# Altium footprint library ICPOWER.PcbLib: 71 footprints (part 4 of 5)
Each footprint in its own frame and in the unit in brackets; x right, y up, seen from the top. Pads: shape width x height; smd on the part's side, far side on the other; paste and mask are expansions set on the pad; w line width, h text height; cw(c..) or ccw(c..) is an arc to the next point about the centre after c.
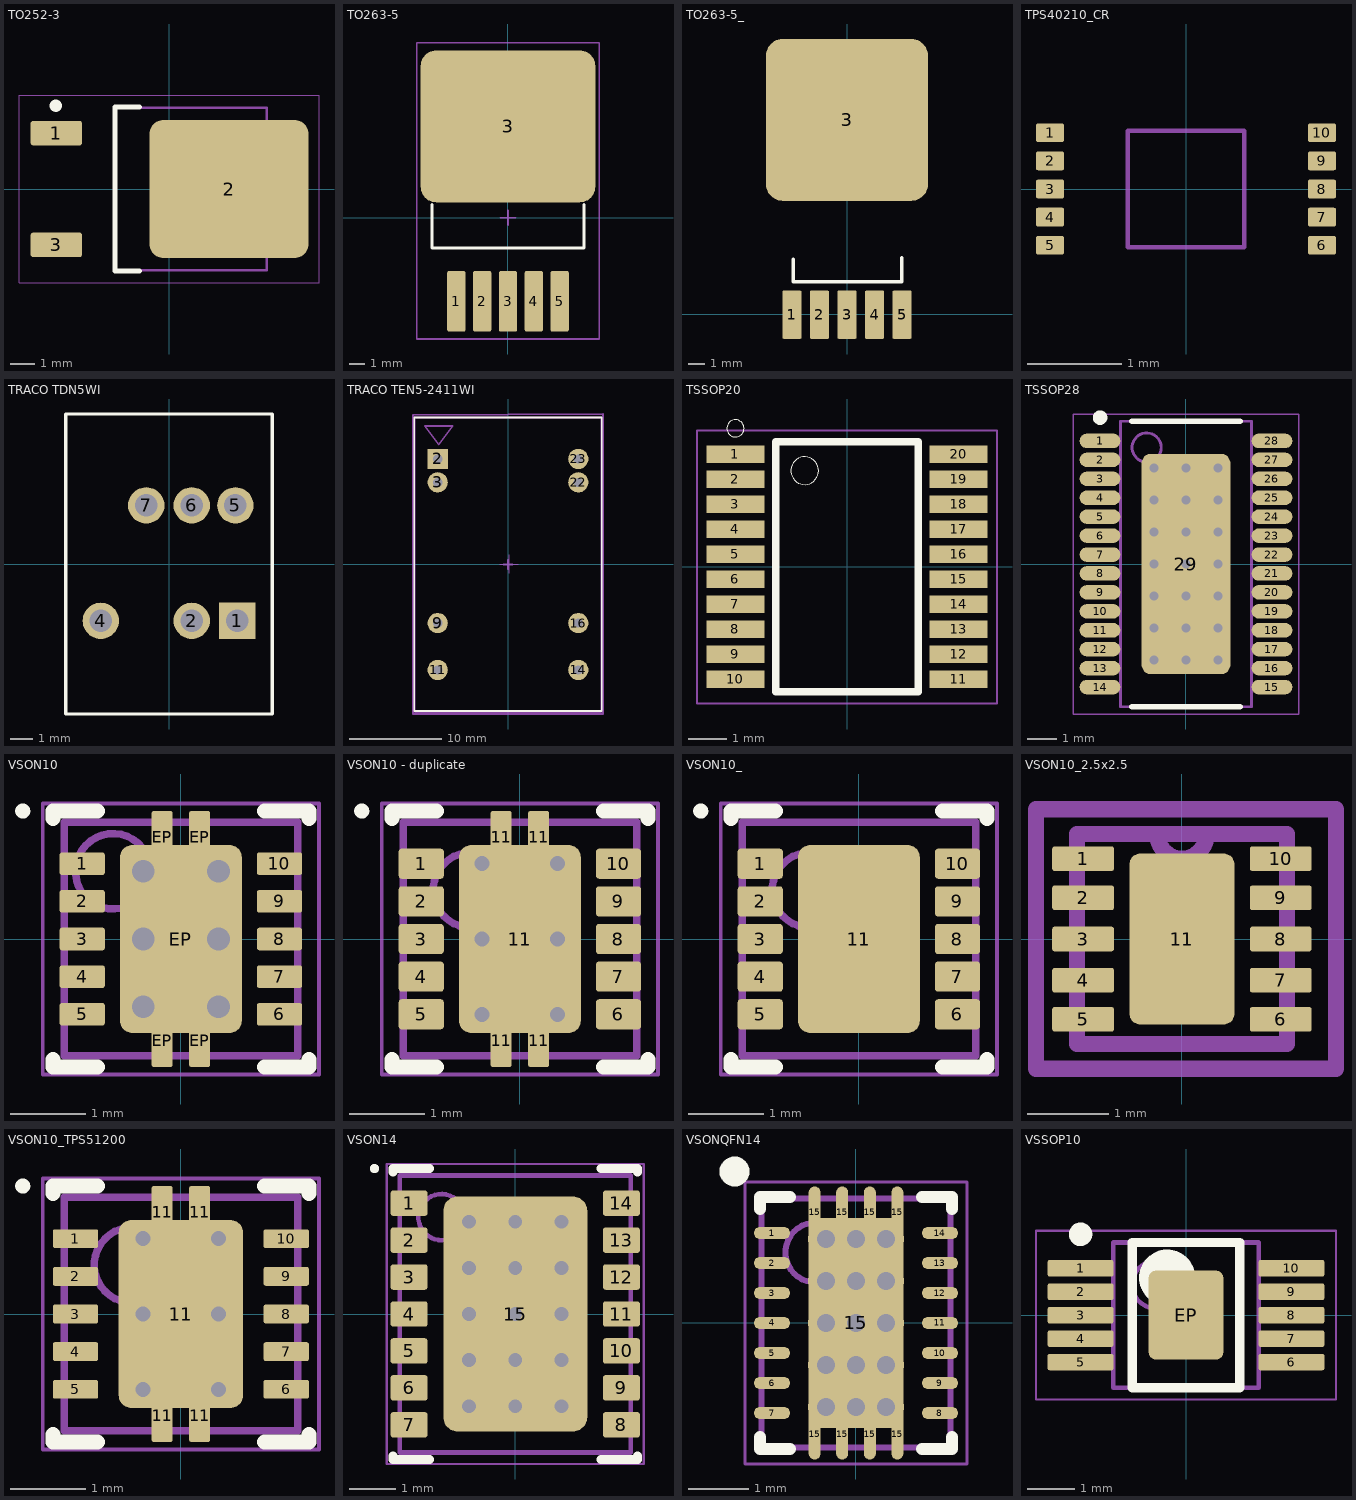
[diagram p3: the footprints below, top view; thin cyan lines are the x and y axes]

## TO252-3 [mm] "DPAK, IPC LOW DENSITY"
height 2.3
pads (3):
  rrect20% 2.1x1 smd: 1(-4.6,2.28) 3(-4.6,-2.28)
  rrect20% 6.5x5.65 smd: 2(2.45,0)
Top Overlay:
  circle w0.25: c-4.625,3.4 r0.125
  lines w0.2: -1.2,-3.35 -2.2,-3.35 -2.2,3.35 -1.2,3.35
Mechanical 13:
  lines w0.1: -2.2,-3.325 -2.2,3.325 4,3.325 4,-3.325 -2.2,-3.325
Mechanical 15:
  lines w0.05: -6.125,-3.825 -6.125,3.825 6.125,3.825 6.125,-3.825 -6.125,-3.825
  lines w0.1: -0.5,0 0.5,0 ; 0,-0.5 0,0.5
3D body "User Library-DPAK_TO-252AA.step": height 2.42, standoff 0.02, extent -4.9,-3.359 5.2,3.375

## TO263-5 [mm]
height 0.025
pads (6):
  rrect20% 1.2x4 smd mask+0.102: 1(-3.4,-5.5) 2(-1.7,-5.5) 3(0,-5.5) 4(1.7,-5.5) 5(3.4,-5.5)
  rrect20% 11.5x10 smd: 3(0,6.017)
Top Overlay:
  lines w0.203: -5,0.862 -5,-1.983 5,-1.983 5,0.862
Mechanical 15:
  lines w0.1: -0.5,0 0.5,0 ; 0,-0.5 0,0.5 ; -6,-7.983 6,-7.983 6,11.517 -6,11.517 -6,-7.983
3D body "SW3dPS-TO263-5.STEP": height 4.83, standoff 0.03, extent -5,-6.973 5,8.697

## TO263-5_ [mm]
height 0.025
pads (6):
  rrect20% 1.2x3 smd mask+0.102: 1(-3.4,-0.033) 2(-1.7,-0.033) 3(0,-0.033) 4(1.7,-0.033) 5(3.4,-0.033)
  rrect20% 10x10 smd: 3(0,12)
Top Overlay:
  lines w0.203: -3.317,3.4 -3.317,1.999 3.389,1.999 3.389,3.5
3D body "SW3dPS-TO263-5.STEP": height 4.83, standoff 0.03, extent -5,-0.99 5,14.68

## TPS40210_CR [mm]
pads (10):
  rrect20% 0.3x0.2 smd mask+0.025: 1(-1.45,0.6) 2(-1.45,0.3) 3(-1.45,0) 4(-1.45,-0.3) 5(-1.45,-0.6) 6(1.45,-0.6) 7(1.45,-0.3) 8(1.45,0) 9(1.45,0.3) 10(1.45,0.6)
M1_3D_TOP:
  lines w0.05: -0.623,-0.619 -0.623,0.619 ; -0.619,-0.623 0.619,-0.623 ; -0.619,0.623 0.619,0.623 ; 0.623,-0.619 0.623,0.619
3D body: height 0.42, standoff 0.38, extent 1.41,-0.615 1.44,-0.585
3D body: height 0.4, standoff 0, extent 1.41,-0.615 1.44,-0.585
3D body: height 0.42, standoff 0.38, extent 1.41,-0.315 1.44,-0.285
3D body: height 0.4, standoff 0, extent 1.41,-0.315 1.44,-0.285
3D body: height 0.42, standoff 0.38, extent 1.41,-0.015 1.44,0.015
3D body: height 0.4, standoff 0, extent 1.41,-0.015 1.44,0.015
3D body: height 0.42, standoff 0.38, extent 1.385,0.285 1.415,0.315
3D body: height 0.4, standoff 0, extent 1.385,0.285 1.415,0.315
3D body: height 0.42, standoff 0.38, extent 1.41,0.61 1.44,0.64
3D body: height 0.4, standoff 0, extent 1.41,0.61 1.44,0.64
3D body: height 0.41, standoff 0.38, extent 0.419,0.077 1.403,0.315
3D body: height 0.41, standoff 0.38, extent 0.429,-0.611 1.425,-0.459
3D body: height 0.41, standoff 0.38, extent 0.428,-0.315 1.426,-0.198
3D body: height 0.41, standoff 0.38, extent 0.426,-0.09 1.426,0.01
3D body: height 0.41, standoff 0.38, extent 0.432,0.475 1.427,0.644
3D body: height 0.4, standoff 0, extent -1.44,-0.615 -1.41,-0.585
3D body: height 0.42, standoff 0.38, extent -1.44,-0.615 -1.41,-0.585
3D body: height 0.4, standoff 0, extent -1.44,-0.315 -1.41,-0.285
3D body: height 0.42, standoff 0.38, extent -1.44,-0.315 -1.41,-0.285
3D body: height 0.4, standoff 0, extent -1.44,0.585 -1.41,0.615
3D body: height 0.42, standoff 0.38, extent -1.44,0.585 -1.41,0.615
3D body: height 0.4, standoff 0, extent -1.44,0.285 -1.41,0.315
3D body: height 0.42, standoff 0.38, extent -1.44,0.285 -1.41,0.315
3D body: height 0.42, standoff 0.38, extent -1.44,-0.015 -1.41,0.015
3D body: height 0.4, standoff 0, extent -1.44,-0.015 -1.41,0.015
3D body: height 0.38, standoff 0.01, extent -0.625,-0.625 0.625,0.625
3D body: height 0.4, standoff 0.39, extent -0.5,0.425 -0.375,0.55
3D body: height 0.4, standoff 0.39, extent -0.5,0.063 -0.375,0.188
3D body: height 0.4, standoff 0.39, extent -0.5,-0.075 -0.375,0.05
3D body: height 0.4, standoff 0.39, extent -0.5,-0.325 -0.375,-0.2
3D body: height 0.4, standoff 0.39, extent -0.5,-0.575 -0.375,-0.45
3D body: height 0.4, standoff 0.39, extent 0.375,-0.125 0.5,0
3D body: height 0.4, standoff 0.39, extent 0.375,0.013 0.5,0.138
3D body: height 0.4, standoff 0.39, extent 0.375,-0.525 0.5,-0.4
3D body: height 0.4, standoff 0.39, extent 0.375,-0.275 0.5,-0.15
3D body: height 0.4, standoff 0.39, extent 0.375,0.45 0.5,0.575
3D body: height 0.41, standoff 0.38, extent -1.426,0.467 -0.43,0.619
3D body: height 0.41, standoff 0.38, extent -1.423,0.109 -0.433,0.312
3D body: height 0.41, standoff 0.38, extent -1.425,-0.032 -0.425,0.015
3D body: height 0.41, standoff 0.38, extent -1.425,-0.322 -0.424,-0.258
3D body: height 0.41, standoff 0.38, extent -1.426,-0.611 -0.427,-0.494

## TRACO TDN5WI [mm]
pads (6):
  rect 1.6x1.6 hole 1: 1(3,-2.5)
  round 1.6 hole 1: 2(1,-2.5) 4(-3,-2.5) 5(2.92,2.58) 6(1,2.58) 7(-1,2.58)
Top Overlay:
  lines w0.152: -4.55,-6.6 -4.55,6.6 4.55,6.6 4.55,-6.6 -4.55,-6.6

## TRACO TEN5-2411WI [mm] "TEN5-2411WI"
pads (8):
  rect 2.2x2.2 hole 1: 2(-7.62,11.43)
  round 2.2 hole 1: 3(-7.62,8.89) 9(-7.62,-6.35) 11(-7.62,-11.43) 14(7.62,-11.43) 16(7.62,-6.35) 22(7.62,8.89) 23(7.62,11.43)
Top Overlay:
  lines w0.2: -10.15,-15.87 10.15,-15.87 10.15,15.93 -10.15,15.93 -10.15,-15.87
M3_comm_top:
  text ".comment" at -3,-0.5 h2
M5_asm_top:
  lines w0.2: -10.1,-16 10.1,-16 10.1,15.93 -10.1,15.93 -10.1,-16 ; -9,15 -6,15 -7.5,13 -9,15
  text ".Designator" at -2.2,16.5 h2
M7_courtyard_top:
  lines w0.2: -0.5,0 0.5,0 ; 0,-0.5 0,0.5 ; -10.3,-16.2 -10.3,16.2 10.3,16.3 10.3,-16.2 -10.3,-16.2
Mechanical 15:
  lines w0.1: -0.87,0.03 1.13,0.03 ; 0.13,-0.97 0.13,1.03
3D body "User Library-TracoPSU-Ten5-2423.step": height 10.06, standoff -2, extent -10,-16 10,16

## TSSOP20 [mm] "BQ7692000PW"
pads (20):
  rect 1.5x0.45 smd: 1(-2.9,2.925) 2(-2.9,2.275) 3(-2.9,1.625) 4(-2.9,0.975) 5(-2.9,0.325) 6(-2.9,-0.325) 7(-2.9,-0.975) 8(-2.9,-1.625) 9(-2.9,-2.275) 10(-2.9,-2.925) 11(2.9,-2.925) 12(2.9,-2.275) 13(2.9,-1.625) 14(2.9,-0.975) 15(2.9,-0.325) 16(2.9,0.325) 17(2.9,0.975) 18(2.9,1.625) 19(2.9,2.275) 20(2.9,2.925)
Top Overlay:
  circle w0: c-2.9,3.6 r0.224
  circle w0: c-1.1,2.5 r0.361
  lines w0.2: -1.85,-3.25 -1.85,3.25 1.85,3.25 1.85,-3.25 -1.85,-3.25
M1_3D_TOP:
  lines w0.05: -3.9,-3.55 -3.9,3.55 3.9,3.55 3.9,-3.55 -3.9,-3.55

## TSSOP28 [mm] "EXPOSEDPAD, IPC Medium Density"
height 1.2
pads (29):
  oval 1.4x0.5 smd: 1(-2.95,4.225) 2(-2.95,3.575) 3(-2.95,2.925) 4(-2.95,2.275) 5(-2.95,1.625) 6(-2.95,0.975) 7(-2.95,0.325) 8(-2.95,-0.325) 9(-2.95,-0.975) 10(-2.95,-1.625) 11(-2.95,-2.275) 12(-2.95,-2.925) 13(-2.95,-3.575) 14(-2.95,-4.225) 15(2.95,-4.225) 16(2.95,-3.575) 17(2.95,-2.925) 18(2.95,-2.275) 19(2.95,-1.625) 20(2.95,-0.975) 21(2.95,-0.325) 22(2.95,0.325) 23(2.95,0.975) 24(2.95,1.625) 25(2.95,2.275) 26(2.95,2.925) 27(2.95,3.575) 28(2.95,4.225)
  rrect20% 3.05x7.56 smd: 29(0,0)
via 1.1,-3.3 diameter 0.6 hole 0.3
via 0,-3.3 diameter 0.6 hole 0.3
via -1.1,-3.3 diameter 0.6 hole 0.3
via 1.1,-2.2 diameter 0.6 hole 0.3
via 0,-2.2 diameter 0.6 hole 0.3
via -1.1,-2.2 diameter 0.6 hole 0.3
via 1.1,-1.1 diameter 0.6 hole 0.3
via 0,-1.1 diameter 0.6 hole 0.3
via -1.1,-1.1 diameter 0.6 hole 0.3
via 1.1,0 diameter 0.6 hole 0.3
via 0,0 diameter 0.6 hole 0.3
via -1.1,0 diameter 0.6 hole 0.3
via 1.1,1.1 diameter 0.6 hole 0.3
via 0,1.1 diameter 0.6 hole 0.3
via -1.1,1.1 diameter 0.6 hole 0.3
via 1.1,2.2 diameter 0.6 hole 0.3
via 0,2.2 diameter 0.6 hole 0.3
via -1.1,2.2 diameter 0.6 hole 0.3
via 1.1,3.3 diameter 0.6 hole 0.3
via 0,3.3 diameter 0.6 hole 0.3
via -1.1,3.3 diameter 0.6 hole 0.3
Top Overlay:
  circle w0.25: c-2.95,5.025 r0.125
  lines w0.2: -1.85,-4.9 1.85,-4.9 ; -1.85,4.9 1.85,4.9
Mechanical 13:
  circle w0.1: c-1.35,4 r0.5
  lines w0.1: -2.25,-4.9 2.25,-4.9 2.25,4.9 -2.25,4.9 -2.25,-4.9
Mechanical 15:
  lines w0.05: -3.875,-5.15 3.875,-5.15 3.875,5.15 -3.875,5.15 -3.875,-5.15
  lines w0.1: -0.5,0 0.5,0 ; 0,-0.5 0,0.5
3D body "TSSOP-28_P065.STEP": height 0.98, standoff -0.01, extent -3.2,-4.85 3.2,4.85

## VSON10 [mm] "TPS40210DRCR  , VSON10, IPC Medium Density"
height 1
pads (15):
  rrect20% 0.6x0.3 smd: 1(-1.31,1) 2(-1.31,0.5) 3(-1.31,0) 4(-1.31,-0.5) 5(-1.31,-1) 6(1.31,-1) 7(1.31,-0.5) 8(1.31,0) 9(1.31,0.5) 10(1.31,1)
  rrect20% 0.28x0.7 smd: EP(-0.25,-1.35) EP(-0.25,1.35) EP(0.25,-1.35) EP(0.25,1.35)
  rrect20% 1.62x2.5 smd: EP(0,0)
via 0.5,0 diameter 0.6 hole 0.3
via -0.5,0 diameter 0.6 hole 0.3
via 0.5,-0.9 diameter 0.6 hole 0.3
via -0.5,-0.9 diameter 0.6 hole 0.3
via -0.5,0.9 diameter 0.6 hole 0.3
via 0.5,0.9 diameter 0.6 hole 0.3
Top Overlay:
  circle w0.1: c-2.1,1.7 r0.05
  lines w0.2: -1.7,-1.6 -1.7,-1.7 -1.11,-1.7 ; -1.7,1.6 -1.7,1.7 -1.11,1.7 ; 1.11,-1.7 1.7,-1.7 1.7,-1.6 ; 1.11,1.7 1.7,1.7 1.7,1.6
M3_comm_top:
  text ".comment" at -2.9,-1.3 h2
M5_asm_top:
  circle w0.1: c-0.9,0.9 r0.5
  lines w0.1: -1.55,-1.55 1.55,-1.55 1.55,1.55 -1.55,1.55 -1.55,-1.55
  text ".Designator" at -1.11,1.7 h2
M7_courtyard_top:
  lines w0.05: -1.835,-1.8 1.835,-1.8 1.835,1.8 -1.835,1.8 -1.835,-1.8
  lines w0.1: -0.5,0 0.5,0 ; 0,-0.5 0,0.5
3D body: height 1, standoff 0.05, extent -1.55,-1.55 1.55,1.55

## VSON10 - duplicate [mm] "VSON10, IPC Medium Density"
height 1
pads (15):
  rrect20% 0.6x0.4 smd: 1(-1.31,1) 2(-1.31,0.5) 3(-1.31,0) 4(-1.31,-0.5) 5(-1.31,-1) 6(1.31,-1) 7(1.31,-0.5) 8(1.31,0) 9(1.31,0.5) 10(1.31,1)
  rrect20% 0.28x0.7 smd: 11(-0.25,-1.35) 11(-0.25,1.35) 11(0.25,-1.35) 11(0.25,1.35)
  rrect20% 1.62x2.5 smd: 11(0,0)
via 0.5,-1 diameter 0.5 hole 0.2
via -0.5,-1 diameter 0.5 hole 0.2
via 0.5,0 diameter 0.5 hole 0.2
via -0.5,0 diameter 0.5 hole 0.2
via 0.5,1 diameter 0.5 hole 0.2
via -0.5,1 diameter 0.5 hole 0.2
Top Overlay:
  circle w0.1: c-2.1,1.7 r0.05
  lines w0.2: -1.7,-1.6 -1.7,-1.7 -1.11,-1.7 ; -1.7,1.6 -1.7,1.7 -1.11,1.7 ; 1.11,-1.7 1.7,-1.7 1.7,-1.6 ; 1.11,1.7 1.7,1.7 1.7,1.6
Mechanical 13:
  circle w0.1: c-0.65,0.65 r0.5
  lines w0.1: -1.55,-1.55 1.55,-1.55 1.55,1.55 -1.55,1.55 -1.55,-1.55
Mechanical 15:
  lines w0.05: -1.835,-1.8 1.835,-1.8 1.835,1.8 -1.835,1.8 -1.835,-1.8
  lines w0.1: -0.5,0 0.5,0 ; 0,-0.5 0,0.5
3D body: height 1, standoff 0.05, extent -1.55,-1.55 1.55,1.55

## VSON10_ [mm] "VSON10, IPC Medium Density"
height 1
pads (11):
  rrect20% 0.6x0.4 smd mask+0.025: 1(-1.31,1) 2(-1.31,0.5) 3(-1.31,0) 4(-1.31,-0.5) 5(-1.31,-1) 6(1.31,-1) 7(1.31,-0.5) 8(1.31,0) 9(1.31,0.5) 10(1.31,1)
  rrect20% 1.62x2.5 smd mask+0.025: 11(0,0)
Top Overlay:
  circle w0.1: c-2.1,1.7 r0.05
  lines w0.2: -1.7,-1.6 -1.7,-1.7 -1.11,-1.7 ; -1.7,1.6 -1.7,1.7 -1.11,1.7 ; 1.11,-1.7 1.7,-1.7 1.7,-1.6 ; 1.11,1.7 1.7,1.7 1.7,1.6
Mechanical 13:
  circle w0.1: c-0.65,0.65 r0.5
  lines w0.1: -1.55,-1.55 1.55,-1.55 1.55,1.55 -1.55,1.55 -1.55,-1.55
Mechanical 15:
  lines w0.05: -1.835,-1.8 1.835,-1.8 1.835,1.8 -1.835,1.8 -1.835,-1.8
  lines w0.1: -0.5,0 0.5,0 ; 0,-0.5 0,0.5
3D body: height 1, standoff 0.05, extent -1.55,-1.55 1.55,1.55

## VSON10_2.5x2.5 [mil] "TPS63030"
pads (11):
  rrect20% 30x12 smd: 1(-48,39) 2(-48,20) 3(-48,0) 4(-48,-20) 5(-48,-39) 6(48,-39) 7(48,-20) 8(48,0) 9(48,20) 10(48,39)
  rrect20% 51x83 smd: 11(0,0)
M3_comm_top:
  text ".comment" at -35.43,-11.81 h39.37
M5_asm_top:
  lines w7.87: -51,-51 -51,51 ; -51,-51 51,-51 ; -51,-51 -51,51 ; -51,-51 51,-51 ; -51,51 -12,51 ; -51,51 -12,51 ; -12,51 ccw(c0,51) 12,51 ; -12,51 ccw(c0,51) 12,51 ; -12,51 12,51 ; -12,51 12,51 ; 12,51 51,51 ; 12,51 51,51 ; 51,-51 51,51 ; 51,-51 51,51
  text ".Designator" at -47.24,62.99 h39.37
M7_courtyard_top:
  lines w7.87: -19.68,0 19.68,0 ; 0,-19.68 0,19.68 ; -70.87,-62.99 74.8,-62.99 74.8,62.99 -70.87,62.99 -70.87,-62.99
3D body "TPS74801.step": height 39.37, standoff 0, extent -59.05,-59.06 59.06,59.06

## VSON10_TPS51200 [mm] "TPS51200, VSON10, IPC Medium Density"
height 1
pads (15):
  rrect20% 0.6x0.25 smd: 1(-1.4,1) 2(-1.4,0.5) 3(-1.4,0) 4(-1.4,-0.5) 5(-1.4,-1) 6(1.4,-1) 7(1.4,-0.5) 8(1.4,0) 9(1.4,0.5) 10(1.4,1)
  rrect20% 0.28x0.7 smd: 11(-0.25,-1.35) 11(-0.25,1.35) 11(0.25,-1.35) 11(0.25,1.35)
  rrect20% 1.65x2.5 smd: 11(0,0)
via 0.5,-1 diameter 0.5 hole 0.2
via -0.5,-1 diameter 0.5 hole 0.2
via 0.5,0 diameter 0.5 hole 0.2
via -0.5,0 diameter 0.5 hole 0.2
via 0.5,1 diameter 0.5 hole 0.2
via -0.5,1 diameter 0.5 hole 0.2
Top Overlay:
  circle w0.1: c-2.1,1.7 r0.05
  lines w0.2: -1.7,-1.6 -1.7,-1.7 -1.11,-1.7 ; -1.7,1.6 -1.7,1.7 -1.11,1.7 ; 1.11,-1.7 1.7,-1.7 1.7,-1.6 ; 1.11,1.7 1.7,1.7 1.7,1.6
Mechanical 13:
  circle w0.1: c-0.65,0.65 r0.5
  lines w0.1: -1.55,-1.55 1.55,-1.55 1.55,1.55 -1.55,1.55 -1.55,-1.55
Mechanical 15:
  lines w0.05: -1.835,-1.8 1.835,-1.8 1.835,1.8 -1.835,1.8 -1.835,-1.8
  lines w0.1: -0.5,0 0.5,0 ; 0,-0.5 0,0.5
3D body: height 1, standoff 0.05, extent -1.55,-1.55 1.55,1.55

## VSON14 [mm] "VSON, IPC Medium Density"
height 1
pads (15):
  rrect20% 0.8x0.55 smd: 1(-2.3,2.4) 2(-2.3,1.6) 3(-2.3,0.8) 4(-2.3,0) 5(-2.3,-0.8) 6(-2.3,-1.6) 7(-2.3,-2.4) 8(2.3,-2.4) 9(2.3,-1.6) 10(2.3,-0.8) 11(2.3,0) 12(2.3,0.8) 13(2.3,1.6) 14(2.3,2.4)
  rrect20% 3.12x5.1 smd paste-1.56 mask+0: 15(0,0)
via 1,-2 diameter 0.6 hole 0.3
via 0,-2 diameter 0.6 hole 0.3
via -1,-2 diameter 0.6 hole 0.3
via 1,-1 diameter 0.6 hole 0.3
via 0,-1 diameter 0.6 hole 0.3
via -1,-1 diameter 0.6 hole 0.3
via 1,0 diameter 0.6 hole 0.3
via 0,0 diameter 0.6 hole 0.3
via -1,0 diameter 0.6 hole 0.3
via 1,1 diameter 0.6 hole 0.3
via 0,1 diameter 0.6 hole 0.3
via -1,1 diameter 0.6 hole 0.3
via 1,2 diameter 0.6 hole 0.3
via 0,2 diameter 0.6 hole 0.3
via -1,2 diameter 0.6 hole 0.3
Top Overlay:
  circle w0.1: c-3.05,3.15 r0.05
  lines w0.2: -2.65,-3.075 -2.65,-3.15 -1.86,-3.15 ; -2.65,3.075 -2.65,3.15 -1.86,3.15 ; 1.86,-3.15 2.65,-3.15 2.65,-3.075 ; 1.86,3.15 2.65,3.15 2.65,3.075
Top Paste:
  rectangle: 0.1,-2.46 1.46,-1.38
  rectangle: 0.1,-1.18 1.46,-0.1
  rectangle: 0.1,0.1 1.46,1.18
  rectangle: 0.1,1.38 1.46,2.46
  rectangle: -1.46,-2.46 -0.1,-1.38
  rectangle: -1.46,-1.18 -0.1,-0.1
  rectangle: -1.46,0.1 -0.1,1.18
  rectangle: -1.46,1.38 -0.1,2.46
Mechanical 13:
  circle w0.1: c-1.6,2.1 r0.5
  lines w0.1: -2.5,-3 2.5,-3 2.5,3 -2.5,3 -2.5,-3
Mechanical 15:
  lines w0.05: -2.785,-3.25 2.785,-3.25 2.785,3.25 -2.785,3.25 -2.785,-3.25
  lines w0.1: -0.5,0 0.5,0 ; 0,-0.5 0,0.5
3D body: height 1, standoff 0.1, extent -2.5,-3 2.5,3

## VSONQFN14 [mm] "PQFN, IPC Medium Density"
height 1
pads (23):
  oval 0.6x0.2 smd: 1(-1.4,1.5) 2(-1.4,1) 3(-1.4,0.5) 4(-1.4,0) 5(-1.4,-0.5) 6(-1.4,-1) 7(-1.4,-1.5) 8(1.4,-1.5) 9(1.4,-1) 10(1.4,-0.5) 11(1.4,0) 12(1.4,0.5) 13(1.4,1) 14(1.4,1.5)
  oval 0.2x0.85 smd: 15(-0.69,-1.85) 15(-0.69,1.85) 15(-0.23,-1.85) 15(-0.23,1.85) 15(0.23,-1.85) 15(0.23,1.85) 15(0.69,-1.85) 15(0.69,1.85)
  rect 1.58x3.5 smd: 15(0,0)
via 0,0 diameter 0.6 hole 0.3
via 0,-0.7 diameter 0.6 hole 0.3
via 0,0.7 diameter 0.6 hole 0.3
via 0,1.4 diameter 0.6 hole 0.3
via 0,-1.4 diameter 0.6 hole 0.3
via 0.5,-1.4 diameter 0.6 hole 0.3
via 0.5,1.4 diameter 0.6 hole 0.3
via 0.5,0.7 diameter 0.6 hole 0.3
via 0.5,-0.7 diameter 0.6 hole 0.3
via 0.5,0 diameter 0.6 hole 0.3
via -0.5,1.4 diameter 0.6 hole 0.3
via -0.5,0.7 diameter 0.6 hole 0.3
via -0.5,-0.7 diameter 0.6 hole 0.3
via -0.5,0 diameter 0.6 hole 0.3
via -0.5,-1.4 diameter 0.6 hole 0.3
Top Overlay:
  circle w0.25: c-2.025,2.525 r0.125
  lines w0.2: -1.6,-1.9 -1.6,-2.1 -1.1,-2.1 ; -1.6,1.9 -1.6,2.1 -1.1,2.1 ; 1.1,-2.1 1.6,-2.1 1.6,-1.9 ; 1.1,2.1 1.6,2.1 1.6,1.9
Mechanical 13:
  circle w0.1: c-0.675,1.175 r0.5
  lines w0.1: -1.575,-2.075 1.575,-2.075 1.575,2.075 -1.575,2.075 -1.575,-2.075
Mechanical 15:
  lines w0.05: -1.85,-2.35 1.85,-2.35 1.85,2.35 -1.85,2.35 -1.85,-2.35
  lines w0.1: -0.5,0 0.5,0 ; 0,-0.5 0,0.5
3D body "VSON-14-1.step": height 1.05, standoff 0, extent -1.602,-2.126 1.608,2.084

## VSSOP10 [mm] "TPS40210DGQR, VSSOP10, IPC Medium Density"
height 1.1
pads (11):
  rrect20% 1.4x0.35 smd mask+0.05: 1(-2.25,1) 2(-2.25,0.5) 3(-2.25,0) 4(-2.25,-0.5) 5(-2.25,-1) 6(2.25,-1) 7(2.25,-0.5) 8(2.25,0) 9(2.25,0.5) 10(2.25,1)
  rrect20% 1.6x1.9 smd mask+0.05: EP(0,0)
Top Overlay:
  circle w0.6: c-0.4,0.8 r0.3
  circle w0.25: c-2.25,1.725 r0.125
  lines w0.2: -1.15,-1.55 1.15,-1.55 1.15,1.55 -1.15,1.55 -1.15,-1.55
M3_comm_top:
  text ".comment" at -2.9,-1.3 h2
M5_asm_top:
  circle w0.1: c-0.65,0.65 r0.5
  lines w0.1: -1.55,-1.55 -1.55,1.55 1.55,1.55 1.55,-1.55 -1.55,-1.55
  text ".Designator" at -1.11,1.7 h2
M7_courtyard_top:
  lines w0.05: -3.2,-1.8 -3.2,1.8 3.2,1.8 3.2,-1.8 -3.2,-1.8
  lines w0.1: -0.5,0 0.5,0 ; 0,-0.5 0,0.5
3D body "VSSOP10_.step": height 1.1, standoff 0, extent -2.525,-1.55 2.525,1.55